# Altium schematic symbol library LATTICEPLDS_Library.SchLib: 291 symbols (part 11 of 32)
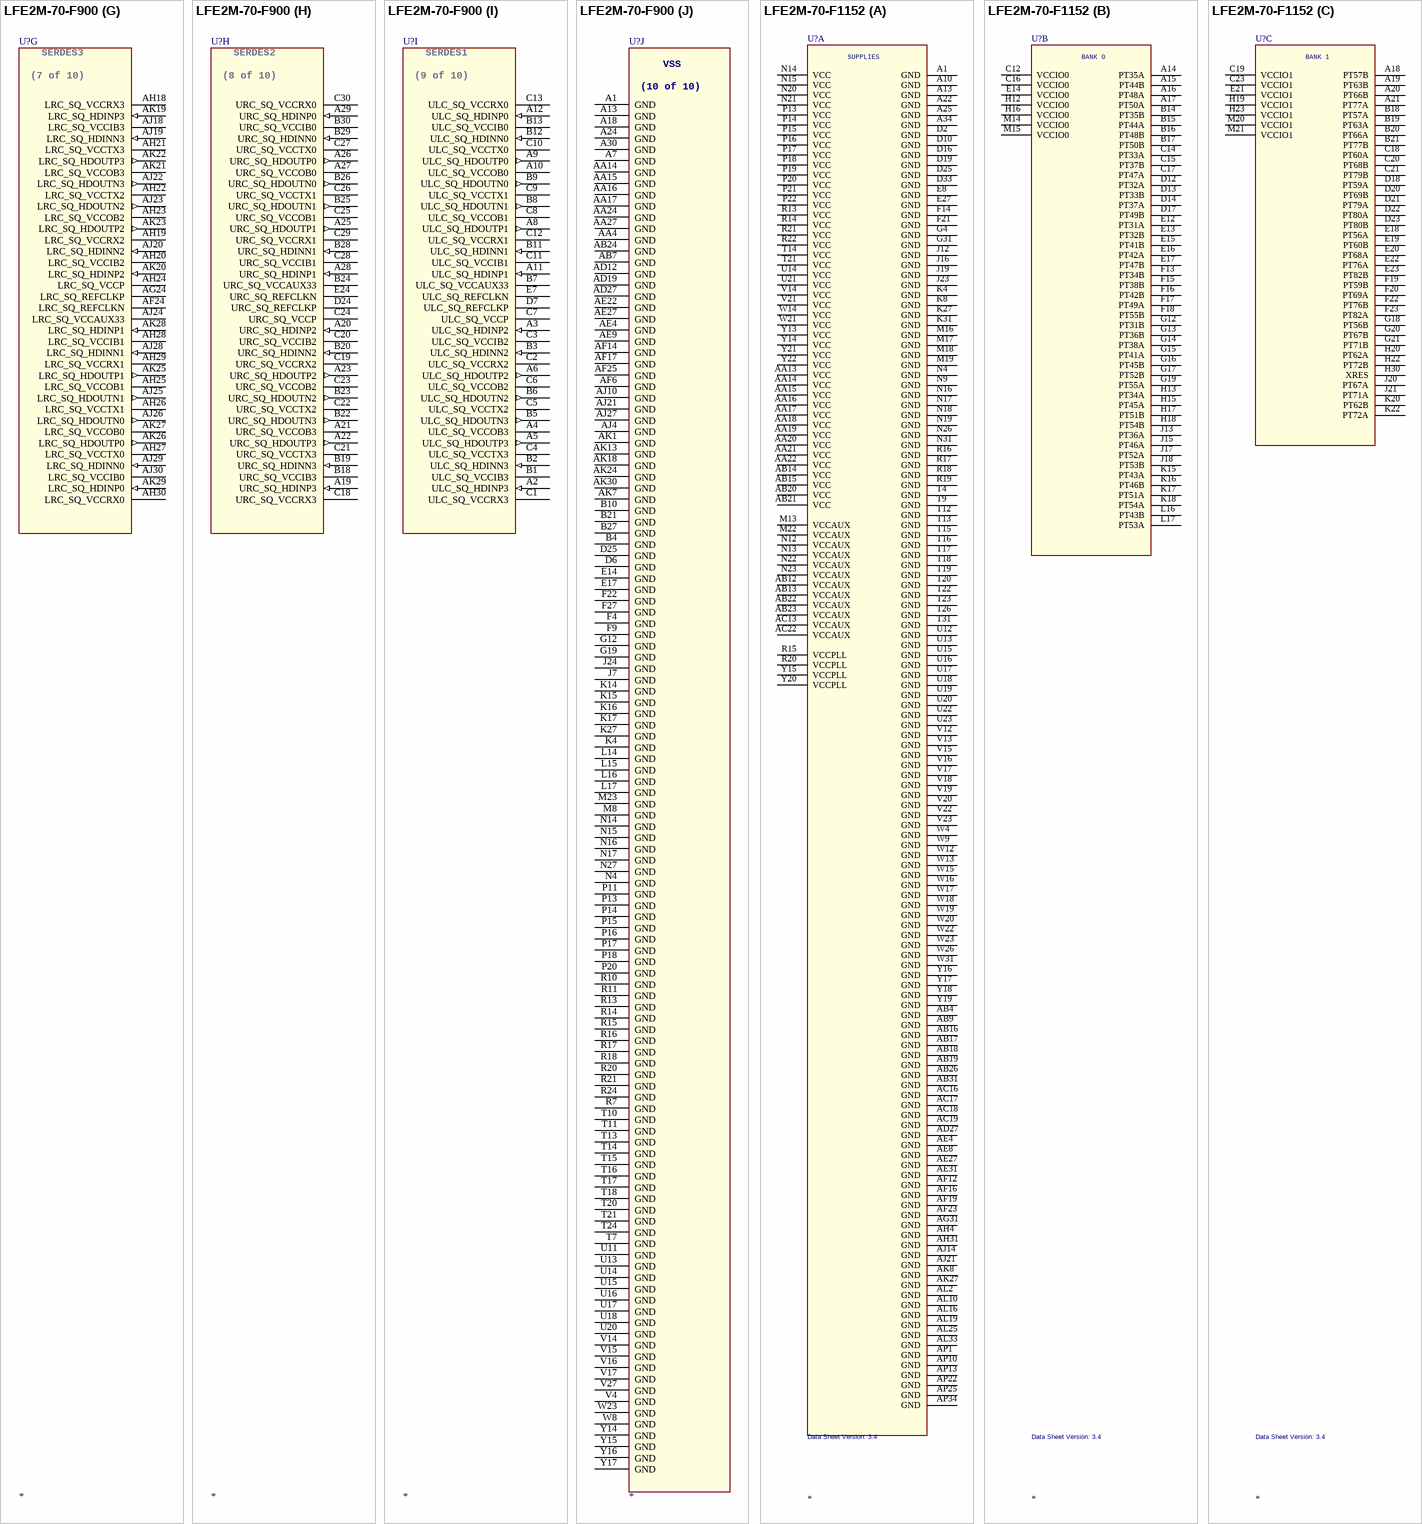
[diagram p313: symbols LFE2M-70-F900 to LFE2M-70-F1152]

## LFE2M-70-F900
designator U?
SPLIT_INST: TRUE; SWAP_INFO: (S1+S2+S3+S4+S5+S6+S7+S8+S9)
part A pins: AA1 PL73A (LDQS73) (io), AA2 PL73B (io), AA3 VCCIO6 (power), AA5 PL79A (io), AA6 PL79B (io), AA7 PL76B (io), AA8 PL81A (io), AA9 PL81B (io), AB1 PL74B (io), AB2 PL78A (io), AB3 PL78B (io), AB4 PL80A (io), AB5 PL80B (io), AB6 VCCIO6 (power), AB8 LLM0_PLLCAP (power), AC1 PL82A (LLM0_GPLLT_IN_A/LDQS82) (io), AC2 PL82B (LLM0_GPLLC_IN_A) (io), AC3 PL83B (LLM0_GPLLC_FB_A) (io), AC4 PL83A (LLM0_GPLLT_FB_A) (io), AC5 PL85A (LLM0_GDLLT_FB_A) (io), AC6 PL84B (LLM0_GDLLC_IN_A) (io), AC7 PL84A (LLM0_GDLLT_IN_A) (io), AD1 PL87B (io), AD2 PL87A (io), AD3 PL85B (LLM0_GDLLC_FB_A) (io), AE3 VCCIO6 (power), D1 PL14B (io), D2 PL9A (VREF2_7) (io), D3 PL9B (VREF1_7) (io), E1 PL17A (io), E2 PL14A (io), E3 PL12A (LUM0_SPLLT_FB_A) (io), E4 PL12B (LUM0_SPLLC_FB_A) (io), F1 PL18A (io), F2 PL17B (io), F3 VCCIO7 (power), F5 PL13B (io), G1 PL24B (io), G2 PL24A (io), G3 PL18B (io), G4 PL15B (io), G5 PL15A (LDQS15) (io), G6 PL13A (io), H1 PL31A (io), H2 PL28B (io), H3 PL28A (LDQS28) (io), H4 PL21B (io), H5 PL21A (io), H7 PL11B (LUM0_SPLLC_IN_A) (io), J1 PL31B (io), J2 PL30B (io), J3 PL30A (io), J4 PL22B (io), J5 PL22A (io), J6 VCCIO7 (power), J8 PL11A (LUM0_SPLLT_IN_A) (io), K1 PL35B (io), K2 PL35A (io), K3 VCCIO7 (power), K5 PL26B (io), K6 PL26A (io), K7 PL16A (io), K8 PL16B (io), L1 PL44A (io), L2 PL42B (LUM3_SPLLC_IN_A) (io), L3 PL42A (LUM3_SPLLT_IN_A) (io), L4 PL33B (io), L5 PL33A (io), L6 PL27B (io), L7 PL25B (io), L8 PL27A (io), L9 PL25A (io), M1 PL46A (LDQS46) (io), M2 PL44B (io), M3 PL39B (io), M4 PL39A (io), M5 PL37B (io), M6 PL37A (LDQS37) (io), M7 VCCIO7 (power), M9 PL29B (io), M10 VCCIO7 (power), N1 PL49A (PCLKT7_0) (io), N2 PL46B (io), N3 VCCIO7 (power), N5 PL38A (io), N6 PL38B (io), N7 PL34B (io), N8 PL29A (io), N9 PL34A (io), N10 VCCIO7 (power), P1 PL49B (PCLKC7_0) (io), P2 PL48B (io), P3 PL48A (io), P4 PL43B (LUM3_SPLLC_FB_A) (io), P5 PL43A (LUM3_SPLLT_FB_A) (io), P6 PL40A (io), P7 PL36B (io), P8 PL40B (io), P9 PL36A (io), P10 VCCIO7 (power), R1 PL54A (io), R2 PL53B (io), R3 PL53A (io), R4 PL45B (io), R5 PL45A (io), R6 VCCIO7 (power), R8 PL47A (io), T1 PL54B (io), T2 PL57B (LLM3_SPLLC_IN_A) (io), T3 PL57A (LLM3_SPLLT_IN_A) (io), T4 PL51B (PCLKC6_0) (io), T5 PL51A (PCLKT6_0) (io), T6 VCCIO6 (power), T8 PL52B (VREF1_6) (io), T9 PL47B (io), U1 PL64A (LDQS64) (io), U2 PL62B (io), U3 PL62A (io), U4 PL60B (io), U5 PL60A (io), U6 PL63B (io), U7 PL52A (VREF2_6) (io), U8 PL58B (LLM3_SPLLC_FB_A) (io), U9 PL58A (LLM3_SPLLT_FB_A) (io), U10 VCCIO6 (power), V1 PL66A (io), V2 PL64B (io), V3 VCCIO6 (power), V5 PL65A (io), V6 PL65B (io), V7 PL61B (io), V8 PL63A (io), V9 PL61A (io), V10 VCCIO6 (power), W1 PL66B (io), W2 PL70A (io), W3 PL69A (io), W4 PL69B (io), W5 PL67A (io), W6 PL67B (io), W7 VCCIO6 (power), W10 VCCIO6 (power), Y1 PL71A (io), Y2 PL71B (io), Y3 PL74A (io), Y4 PL70B (io), Y5 PL72A (io), Y6 PL72B (io), Y7 PL76A (io), Y8 PL75B (io), Y9 PL75A (io)
part B pins: AA12 VCCIO5 (power), AA13 VCCIO5 (power), AA18 VCCIO4 (power), AA19 VCCIO4 (power), AB18 PB79A (io), AC12 PB33B (io), AC13 PB35B (io), AC14 PB36B (io), AC15 PB42B (io), AC16 PB52A (VREF2_5) (io), AC17 PB62B (io), AC18 PB75B (io), AC19 PB78A (BDQS78) (io), AC20 PB79B (io), AC23 PB81A (io), AD9 PB31B (io), AD10 PB32B (io), AD11 PB39A (io), AD13 PB35A (io), AD14 PB40B (io), AD15 PB47A (io), AD16 PB60B (io), AD17 PB67A (io), AD18 PB75A (io), AD20 PB78B (io), AD23 PB81B (io), AD24 PB74A (io), AE8 PB30B (io), AE10 PB32A (io), AE11 PB31A (io), AE12 VCCIO5 (power), AE13 PB33A (BDQS33) (io), AE14 PB36A (io), AE15 PB42A (BDQS42) (io), AE16 PB52B (VREF1_5) (io), AE17 PB62A (io), AE18 PB76A (io), AE19 VCCIO4 (power), AE20 PB80A (io), AE21 PB80B (io), AE24 PB74B (io), AE25 PB73B (io), AF3 PB37A (io), AF4 PB37B (io), AF8 PB41B (io), AF9 VCCIO5 (power), AF10 PB30A (io), AF11 PB53B (PCLKC5_0) (io), AF12 PB40A (io), AF13 PB39B (io), AF15 PB47B (io), AF16 PB51A (BDQS51) (io), AF18 PB60A (BDQS60) (io), AF19 PB67B (io), AF21 PB66A (io), AF22 VCCIO4 (power), AF26 PB73A (io), AG2 PB34A (io), AG3 PB34B (io), AG4 PB38A (io), AG5 PB38B (io), AG6 VCCIO5 (power), AG8 PB41A (io), AG9 PB48B (io), AG10 PB48A (io), AG11 PB53A (PCLKT5_0) (io), AG12 PB49B (io), AG13 PB50B (io), AG14 VCCIO5 (power), AG15 PB50A (io), AG16 PB61B (io), AG17 VCCIO4 (power), AG18 PB65A (io), AG19 PB76B (io), AG20 PB64A (io), AG21 PB64B (io), AG22 PB66B (io), AG25 VCCIO4 (power), AH14 PB49A (io), AH15 PB51B (io), AH16 PB63A (io), AH17 PB71A (io), AJ14 PB58A (PCLKT4_0) (io), AJ15 PB61A (io), AJ16 PB65B (io), AJ17 PB71B (io), AK14 PB58B (PCLKC4_0) (io), AK15 PB59A (VREF2_4) (io), AK16 PB59B (VREF1_4) (io), AK17 PB63B (io)
part C pins: AA22 DI (io), AA23 BUSY (io), AA25 VCCIO8 (power), AA28 VCCIO3 (power), AA29 PR78B (io), AA30 PR83A (RLM0_GPLLT_IN_A) (io), AB22 RLM0_PLLCAP (io), AB23 CSN (in), AB25 VCCIO3 (power), AB26 PR80B (io), AB27 PR80A (io), AB28 PR82A (RLM0_GPLLT_FB_A/RDQS82) (io), AB29 PR82B (RLM0_GPLLC_FB_A) (io), AB30 PR83B (RLM0_GPLLC_IN_A) (io), AC24 INITN (io), AC25 D6 (io), AC26 DOUT_CSON (out), AC27 PR85B (RLM0_GDLLC_FB_A) (io), AC28 PR85A (RLM0_GDLLT_FB_A) (io), AC29 PR84B (RLM0_GDLLC_IN_A) (io), AC30 PR84A (RLM0_GDLLT_IN_A) (io), AD25 CFG1 (in), AD26 D2 (io), AD28 VCCIO8 (power), AD29 D5 (io), AD30 D7 (io), AE26 CS1N (in), AE28 VCCIO3 (power), AE29 D3 (io), AE30 D4 (io), AF27 DONE (io), AF28 WRITEN (in), AF29 D0 (io), AF30 D1 (io), AG27 CFG2 (in), AG28 CFG0 (in), AG29 CCLK (io), AG30 PROGRAMN (in), D27 PR12B (RUM0_SPLLC_FB_A) (io), D28 PR14B (io), D29 PR25A (io), D30 PR25B (io), E27 PR12A (RUM0_SPLLT_FB_A) (io), E28 PR14A (io), E29 PR30A (io), E30 PR30B (io), F24 PR9B (VREF2_2) (io), F25 PR9A (VREF1_2) (io), F26 PR11B (RUM0_SPLLC_IN_A) (io), F28 VCCIO2 (power), F29 PR31A (io), F30 PR31B (io), G24 PR13B (io), G25 PR11A (RUM0_SPLLT_IN_A) (io), G26 PR16A (io), G27 PR27A (io), G28 PR27B (io), G29 PR34A (io), G30 PR38A (io), H23 PR15B (io), H24 PR15A (RDQS15) (io), H25 PR13A (io), H26 PR17A (io), H27 PR16B (io), H28 PR28B (io), H29 PR34B (io), H30 PR38B (io), J22 PR20B (io), J23 PR20A (io), J25 VCCIO2 (power), J26 PR17B (io), J27 PR22B (io), J28 PR28A (RDQS28) (io), J29 PR43A (RUM3_SPLLT_FB_A) (io), J30 PR43B (RUM3_SPLLC_FB_A) (io), K22 PR21A (io), K23 PR21B (io), K24 PR24B (io), K25 PR24A (io), K26 PR22A (io), K28 VCCIO2 (power), K29 PR45A (io), K30 PR45B (io), L22 PR33B (io), L23 PR26A (io), L24 PR26B (io), L25 PR29B (io), L26 PR29A (io), L27 PR35A (io), L28 PR35B (io), L29 PR36A (io), L30 PR36B (io), M21 VCCIO2 (power), M22 PR33A (io), M24 VCCIO2 (power), M25 PR37B (io), M26 PR37A (RDQS37) (io), M27 PR39B (io), M28 PR39A (io), M29 PR49A (PCLKT2_0) (io), M30 PR49B (PCLKC2_0) (io), N21 VCCIO2 (power), N22 PR44B (io), N23 PR42A (RUM3_SPLLT_IN_A) (io), N24 PR42B (RUM3_SPLLC_IN_A) (io), N25 PR40B (io), N26 PR40A (io), N28 VCCIO2 (power), N29 PR53A (io), N30 PR53B (io), P21 VCCIO2 (power), P22 PR44A (io), P23 PR48B (io), P24 PR48A (io), P25 PR46B (io), P26 PR46A (RDQS46) (io), P27 PR47A (io), P28 PR51A (PCLKT3_0) (io), P29 PR51B (PCLKC3_0) (io), P30 PR57B (RLM3_SPLLC_IN_A) (io), R22 PR58A (RLM3_SPLLT_FB_A) (io), R23 PR58B (RLM3_SPLLC_FB_A) (io), R25 VCCIO2 (power), R26 PR47B (io), R27 PR52B (VREF2_3) (io), R28 PR52A (VREF1_3) (io), R29 PR57A (RLM3_SPLLT_IN_A) (io), R30 PR62A (io), T22 PR61A (io), T23 PR61B (io), T25 VCCIO3 (power), T26 PR56A (io), T27 PR56B (io), T28 PR60A (io), T29 PR60B (io), T30 PR62B (io), U21 VCCIO3 (power), U23 PR65B (io), U24 PR63A (io), U25 PR63B (io), U26 PR64A (RDQS64) (io), U27 PR66A (io), U28 PR66B (io), U29 PR71B (io), U30 PR70A (io), V21 VCCIO3 (power), V22 PR75A (io), V23 PR65A (io), V24 PR67B (io), V25 PR67A (io), V26 PR64B (io), V28 VCCIO3 (power), V29 PR71A (io), V30 PR70B (io), W21 VCCIO3 (power), W22 PR75B (io), W24 VCCIO3 (power), W25 PR72B (io), W26 PR72A (io), W27 PR69B (io), W28 PR69A (io), W29 PR73A (RDQS73) (io), W30 PR73B (io), Y22 PR81B (io), Y23 PR81A (io), Y24 PR79B (io), Y25 PR79A (io), Y26 PR74A (io), Y27 PR74B (io), Y28 PR78A (io), Y29 PR76A (io), Y30 PR76B (io)
part D pins: A14 PT51B (io), A15 PT57B (VREF2_1) (io), A16 PT63B (io), A17 PT73B (io), B14 PT51A (io), B15 PT57A (VREF1_1) (io), B16 PT63A (io), B17 PT73A (io), C14 PT54B (VREF2_0) (io), C15 PT55B (PCLKC0_0) (io), C16 PT59B (io), C17 PT74A (io), D4 PT47B (io), D5 PT47A (io), D8 PT43A (io), D9 PT39A (io), D11 PT30A (io), D12 PT37B (io), D13 PT50B (io), D14 VCCIO0 (power), D15 PT55A (PCLKT0_0) (io), D16 PT59A (io), D17 VCCIO1 (power), D18 PT74B (io), D19 PT75B (io), D20 PT77B (io), D21 PT77A (io), D22 PT79B (io), D23 PT82B (io), D26 PT81B (io), E5 PT46B (io), E6 VCCIO0 (power), E8 PT39B (io), E9 VCCIO0 (power), E12 PT30B (io), E13 PT37A (io), E15 PT54A (VREF1_0) (io), E16 PT56A (PCLKT1_0) (io), E18 PT75A (io), E19 PT76A (io), E20 PT76B (io), E21 PT82A (io), E22 VCCIO1 (power), E23 PT80B (io), E25 VCCIO1 (power), E26 PT81A (io), F6 PT46A (io), F7 PT43B (io), F11 PT29A (io), F12 VCCIO0 (power), F13 PT50A (io), F14 PT52B (io), F15 PT56B (PCLKC1_0) (io), F16 PT61A (io), F17 PT64A (io), F18 PT64B (io), F19 VCCIO1 (power), F21 PT79A (io), G11 PT41A (io), G13 PT49B (io), G14 PT53B (io), G15 PT60A (io), G16 PT62A (io), G17 PT62B (io), G18 PT78B (io), G22 PT80A (io), H10 PT31A (io), H11 PT29B (io), H12 PT40A (io), H13 PT40B (io), H14 PT52A (io), H15 PT58A (io), H16 PT61B (io), H17 PT65B (io), H18 PT78A (io), J11 PT49A (io), J12 PT31B (io), J13 PT41B (io), J14 PT53A (io), J15 PT58B (io), J16 PT60B (io), J17 PT65A (io), J18 PT66B (io), J19 PT66A (io), K12 VCCIO0 (power), K13 VCCIO0 (power), K18 VCCIO1 (power), K19 VCCIO1 (power)
part E pins: AA10 VCCAUX (power), AA11 VCCAUX (power), AA20 VCCAUX (power), AA21 VCCAUX (power), AA26 NC, AB9 NC, AB10 NC, AB11 NC, AB12 NC, AB13 NC, AB14 NC, AB15 NC, AB16 NC, AB17 NC, AB19 NC, AB20 NC, AB21 NC, AC8 NC, AC9 NC, AC10 NC, AC11 NC, AC21 NC, AC22 NC, AD4 NC, AD5 NC, AD6 NC, AD7 NC, AD8 NC, AD21 NC, AD22 NC, AE1 TDI (in), AE2 TCK (in), AE5 NC, AE6 NC, AE7 NC, AE23 NC, AF1 TDO (out), AF2 TMS (in), AF5 NC, AF20 NC, AF23 NC, AG1 VCCJ (power), AG23 NC, AG26 NC, D10 NC, E10 NC, E11 NC, F8 NC, F10 NC, F20 NC, F23 NC, G7 NC, G8 NC, G9 NC, G10 NC, G20 NC, G21 NC, G23 XRES (power), H6 NC, H8 NC, H9 NC, H19 NC, H20 NC, H21 NC, H22 NC, J9 NC, J10 NC, J20 NC, J21 NC, K9 NC, K10 VCCAUX (power), K11 VCCAUX (power), K20 VCCAUX (power), K21 VCCAUX (power), L10 VCCAUX (power), L11 VCCAUX (power), L12 VCC (power), L13 VCC (power), L18 VCC (power), L19 VCC (power), L20 VCCAUX (power), L21 VCCAUX (power), M11 VCC (power), M12 VCC (power), M13 VCC (power), M14 VCC (power), M15 VCC (power), M16 VCC (power), M17 VCC (power), M18 VCC (power), M19 VCC (power), M20 VCC (power), N11 VCC (power), N12 VCC (power), N13 VCCPLL (power), N18 VCCPLL (power), N19 VCC (power), N20 VCC (power), P12 VCC (power), P19 VCC (power), R9 NC, R12 VCC (power), R19 VCC (power), T12 VCC (power), T19 VCC (power), U12 VCC (power), U19 VCC (power), U22 NC, V11 VCC (power), V12 VCC (power), V13 VCCPLL (power), V18 VCCPLL (power), V19 VCC (power), V20 VCC (power), W9 NC, W11 VCC (power), W12 VCC (power), W13 VCC (power), W14 VCC (power), W15 VCC (power), W16 VCC (power), W17 VCC (power), W18 VCC (power), W19 VCC (power), W20 VCC (power), Y10 VCCAUX (power), Y11 VCCAUX (power), Y12 VCC (power), Y13 VCC (power), Y18 VCC (power), Y19 VCC (power), Y20 VCCAUX (power), Y21 VCCAUX (power)
part F pins: AF7 LLC_SQ_REFCLKN (in), AG7 LLC_SQ_REFCLKP (in), AH1 LLC_SQ_VCCRX3 (power), AH2 LLC_SQ_VCCRX2 (power), AH3 LLC_SQ_VCCIB2 (power), AH4 LLC_SQ_VCCTX3 (power), AH5 LLC_SQ_VCCTX2 (power), AH6 LLC_SQ_VCCOB2 (power), AH7 LLC_SQ_VCCP (power), AH8 LLC_SQ_VCCOB1 (power), AH9 LLC_SQ_VCCTX1 (power), AH10 LLC_SQ_VCCTX0 (power), AH11 LLC_SQ_VCCIB1 (power), AH12 LLC_SQ_VCCRX1 (power), AH13 LLC_SQ_VCCRX0 (power), AJ1 LLC_SQ_VCCIB3 (power), AJ2 LLC_SQ_HDINN3 (in), AJ3 LLC_SQ_HDINN2 (in), AJ5 LLC_SQ_HDOUTN3 (out), AJ6 LLC_SQ_HDOUTN2 (out), AJ7 LLC_SQ_VCCAUX33 (power), AJ8 LLC_SQ_HDOUTN1 (out), AJ9 LLC_SQ_HDOUTN0 (out), AJ11 LLC_SQ_HDINN1 (in), AJ12 LLC_SQ_HDINN0 (in), AJ13 LLC_SQ_VCCIB0 (power), AK2 LLC_SQ_HDINP3 (in), AK3 LLC_SQ_HDINP2 (in), AK4 LLC_SQ_VCCOB3 (power), AK5 LLC_SQ_HDOUTP3 (out), AK6 LLC_SQ_HDOUTP2 (out), AK8 LLC_SQ_HDOUTP1 (out), AK9 LLC_SQ_HDOUTP0 (out), AK10 LLC_SQ_VCCOB0 (power), AK11 LLC_SQ_HDINP1 (in), AK12 LLC_SQ_HDINP0 (in)
part G pins: AF24 LRC_SQ_REFCLKN (power), AG24 LRC_SQ_REFCLKP (power), AH18 LRC_SQ_VCCRX3 (power), AH19 LRC_SQ_VCCRX2 (power), AH20 LRC_SQ_VCCIB2 (power), AH21 LRC_SQ_VCCTX3 (power), AH22 LRC_SQ_VCCTX2 (power), AH23 LRC_SQ_VCCOB2 (power), AH24 LRC_SQ_VCCP (power), AH25 LRC_SQ_VCCOB1 (power), AH26 LRC_SQ_VCCTX1 (power), AH27 LRC_SQ_VCCTX0 (power), AH28 LRC_SQ_VCCIB1 (power), AH29 LRC_SQ_VCCRX1 (power), AH30 LRC_SQ_VCCRX0 (power), AJ18 LRC_SQ_VCCIB3 (power), AJ19 LRC_SQ_HDINN3 (in), AJ20 LRC_SQ_HDINN2 (in), AJ22 LRC_SQ_HDOUTN3 (out), AJ23 LRC_SQ_HDOUTN2 (out), AJ24 LRC_SQ_VCCAUX33 (power), AJ25 LRC_SQ_HDOUTN1 (out), AJ26 LRC_SQ_HDOUTN0 (out), AJ28 LRC_SQ_HDINN1 (in), AJ29 LRC_SQ_HDINN0 (in), AJ30 LRC_SQ_VCCIB0 (power), AK19 LRC_SQ_HDINP3 (in), AK20 LRC_SQ_HDINP2 (in), AK21 LRC_SQ_VCCOB3 (power), AK22 LRC_SQ_HDOUTP3 (out), AK23 LRC_SQ_HDOUTP2 (out), AK25 LRC_SQ_HDOUTP1 (out), AK26 LRC_SQ_HDOUTP0 (out), AK27 LRC_SQ_VCCOB0 (power), AK28 LRC_SQ_HDINP1 (in), AK29 LRC_SQ_HDINP0 (in)
part H pins: A19 URC_SQ_HDINP3 (in), A20 URC_SQ_HDINP2 (in), A21 URC_SQ_VCCOB3 (power), A22 URC_SQ_HDOUTP3 (out), A23 URC_SQ_HDOUTP2 (out), A25 URC_SQ_HDOUTP1 (out), A26 URC_SQ_HDOUTP0 (out), A27 URC_SQ_VCCOB0 (power), A28 URC_SQ_HDINP1 (in), A29 URC_SQ_HDINP0 (in), B18 URC_SQ_VCCIB3 (power), B19 URC_SQ_HDINN3 (in), B20 URC_SQ_HDINN2 (in), B22 URC_SQ_HDOUTN3 (out), B23 URC_SQ_HDOUTN2 (out), B24 URC_SQ_VCCAUX33 (power), B25 URC_SQ_HDOUTN1 (out), B26 URC_SQ_HDOUTN0 (out), B28 URC_SQ_HDINN1 (in), B29 URC_SQ_HDINN0 (in), B30 URC_SQ_VCCIB0 (power), C18 URC_SQ_VCCRX3 (power), C19 URC_SQ_VCCRX2 (power), C20 URC_SQ_VCCIB2 (power), C21 URC_SQ_VCCTX3 (power), C22 URC_SQ_VCCTX2 (power), C23 URC_SQ_VCCOB2 (power), C24 URC_SQ_VCCP (power), C25 URC_SQ_VCCOB1 (power), C26 URC_SQ_VCCTX1 (power), C27 URC_SQ_VCCTX0 (power), C28 URC_SQ_VCCIB1 (power), C29 URC_SQ_VCCRX1 (power), C30 URC_SQ_VCCRX0 (power), D24 URC_SQ_REFCLKP (power), E24 URC_SQ_REFCLKN (power)
part I pins: A2 ULC_SQ_HDINP3 (in), A3 ULC_SQ_HDINP2 (in), A4 ULC_SQ_VCCOB3 (power), A5 ULC_SQ_HDOUTP3 (out), A6 ULC_SQ_HDOUTP2 (out), A8 ULC_SQ_HDOUTP1 (out), A9 ULC_SQ_HDOUTP0 (out), A10 ULC_SQ_VCCOB0 (power), A11 ULC_SQ_HDINP1 (in), A12 ULC_SQ_HDINP0 (in), B1 ULC_SQ_VCCIB3 (power), B2 ULC_SQ_HDINN3 (in), B3 ULC_SQ_HDINN2 (in), B5 ULC_SQ_HDOUTN3 (out), B6 ULC_SQ_HDOUTN2 (out), B7 ULC_SQ_VCCAUX33 (power), B8 ULC_SQ_HDOUTN1 (out), B9 ULC_SQ_HDOUTN0 (out), B11 ULC_SQ_HDINN1 (in), B12 ULC_SQ_HDINN0 (in), B13 ULC_SQ_VCCIB0 (power), C1 ULC_SQ_VCCRX3 (power), C2 ULC_SQ_VCCRX2 (power), C3 ULC_SQ_VCCIB2 (power), C4 ULC_SQ_VCCTX3 (power), C5 ULC_SQ_VCCTX2 (power), C6 ULC_SQ_VCCOB2 (power), C7 ULC_SQ_VCCP (power), C8 ULC_SQ_VCCOB1 (power), C9 ULC_SQ_VCCTX1 (power), C10 ULC_SQ_VCCTX0 (power), C11 ULC_SQ_VCCIB1 (power), C12 ULC_SQ_VCCRX1 (power), C13 ULC_SQ_VCCRX0 (power), D7 ULC_SQ_REFCLKP (power), E7 ULC_SQ_REFCLKN (power)
part J pins: A1 GND (power), A7 GND (power), A13 GND (power), A18 GND (power), A24 GND (power), A30 GND (power), AA4 GND (power), AA14 GND (power), AA15 GND (power), AA16 GND (power), AA17 GND (power), AA24 GND (power), AA27 GND (power), AB7 GND (power), AB24 GND (power), AD12 GND (power), AD19 GND (power), AD27 GND (power), AE4 GND (power), AE9 GND (power), AE22 GND (power), AE27 GND (power), AF6 GND (power), AF14 GND (power), AF17 GND (power), AF25 GND (power), AJ4 GND (power), AJ10 GND (power), AJ21 GND (power), AJ27 GND (power), AK1 GND (power), AK7 GND (power), AK13 GND (power), AK18 GND (power), AK24 GND (power), AK30 GND (power), B4 GND (power), B10 GND (power), B21 GND (power), B27 GND (power), D6 GND (power), D25 GND (power), E14 GND (power), E17 GND (power), F4 GND (power), F9 GND (power), F22 GND (power), F27 GND (power), G12 GND (power), G19 GND (power), J7 GND (power), J24 GND (power), K4 GND (power), K14 GND (power), K15 GND (power), K16 GND (power), K17 GND (power), K27 GND (power), L14 GND (power), L15 GND (power), L16 GND (power), L17 GND (power), M8 GND (power), M23 GND (power), N4 GND (power), N14 GND (power), N15 GND (power), N16 GND (power), N17 GND (power), N27 GND (power), P11 GND (power), P13 GND (power), P14 GND (power), P15 GND (power), P16 GND (power), P17 GND (power), P18 GND (power), P20 GND (power), R7 GND (power), R10 GND (power), R11 GND (power), R13 GND (power), R14 GND (power), R15 GND (power), R16 GND (power), R17 GND (power), R18 GND (power), R20 GND (power), R21 GND (power), R24 GND (power), T7 GND (power), T10 GND (power), T11 GND (power), T13 GND (power), T14 GND (power), T15 GND (power), T16 GND (power), T17 GND (power), T18 GND (power), T20 GND (power), T21 GND (power), T24 GND (power), U11 GND (power), U13 GND (power), U14 GND (power), U15 GND (power), U16 GND (power), U17 GND (power), U18 GND (power), U20 GND (power), V4 GND (power), V14 GND (power), V15 GND (power), V16 GND (power), V17 GND (power), V27 GND (power), W8 GND (power), W23 GND (power), Y14 GND (power), Y15 GND (power), Y16 GND (power), Y17 GND (power)

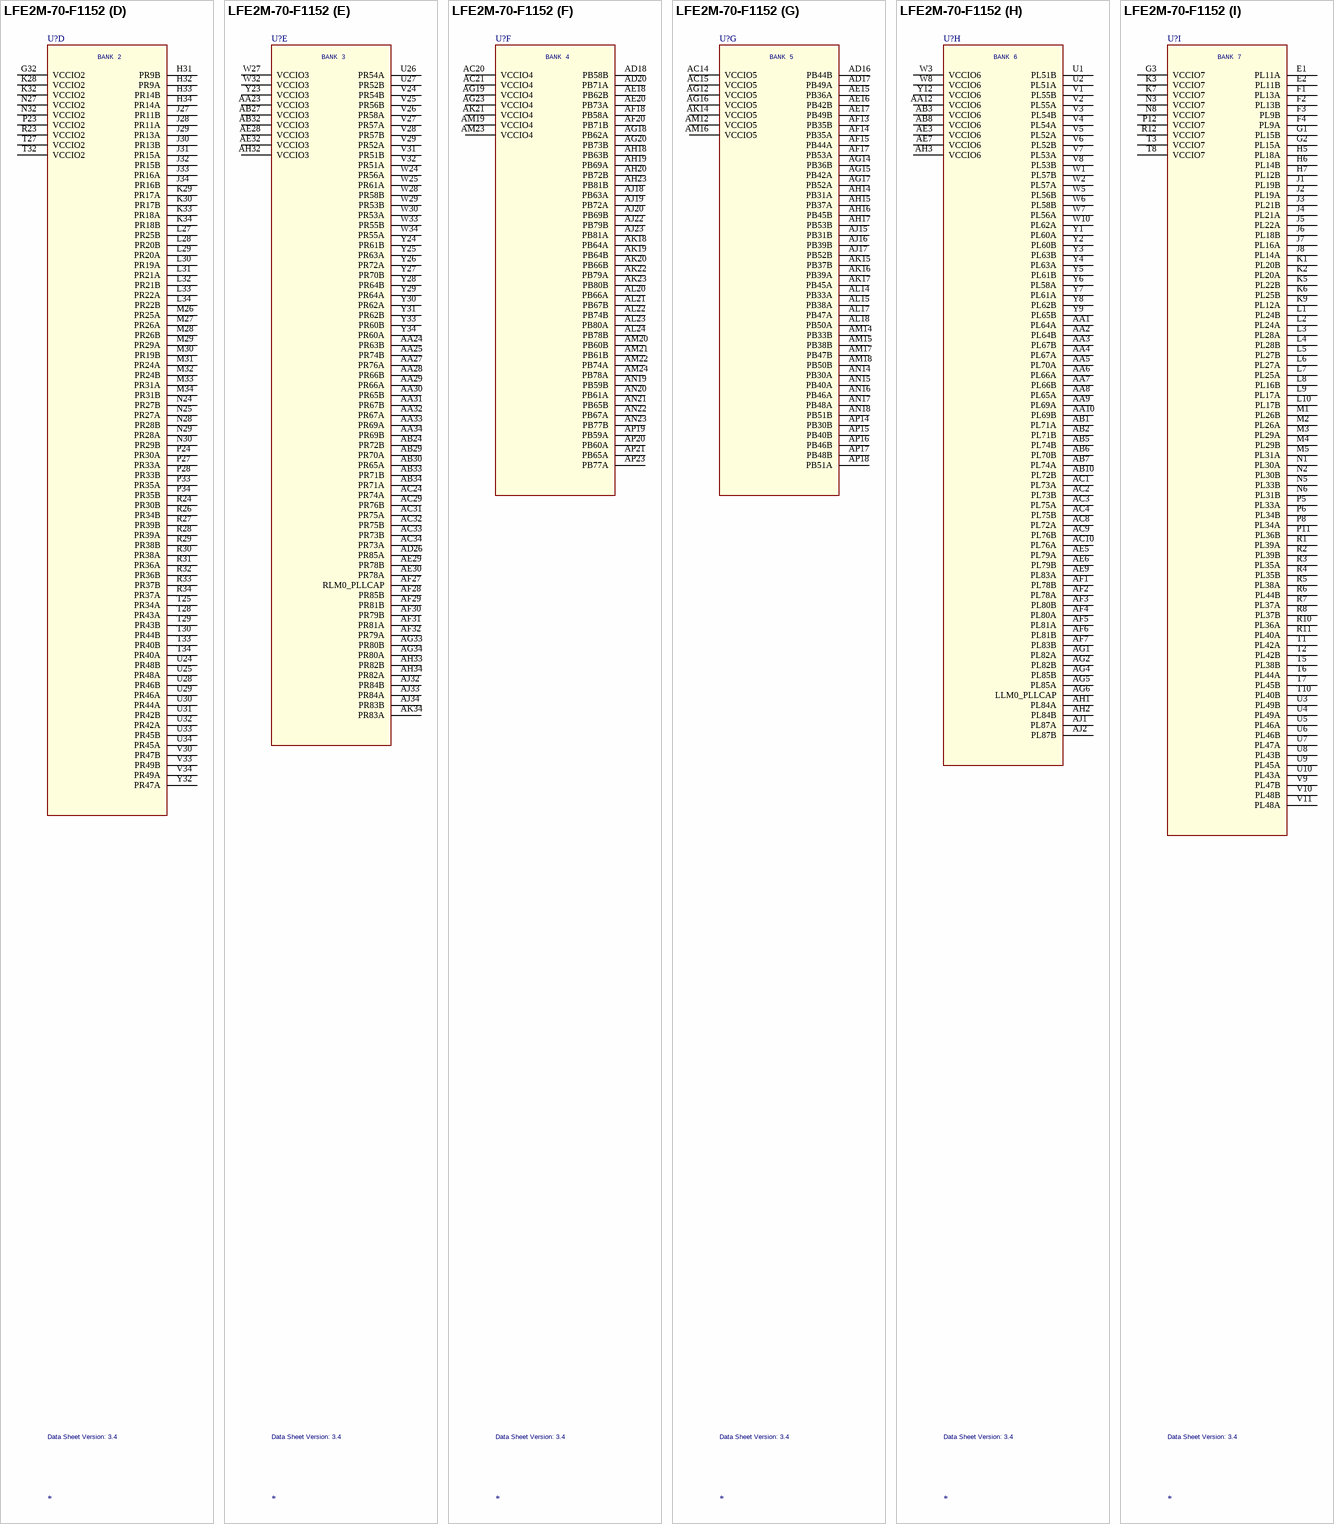
[diagram p115: symbol LFE2M-70-F1152]

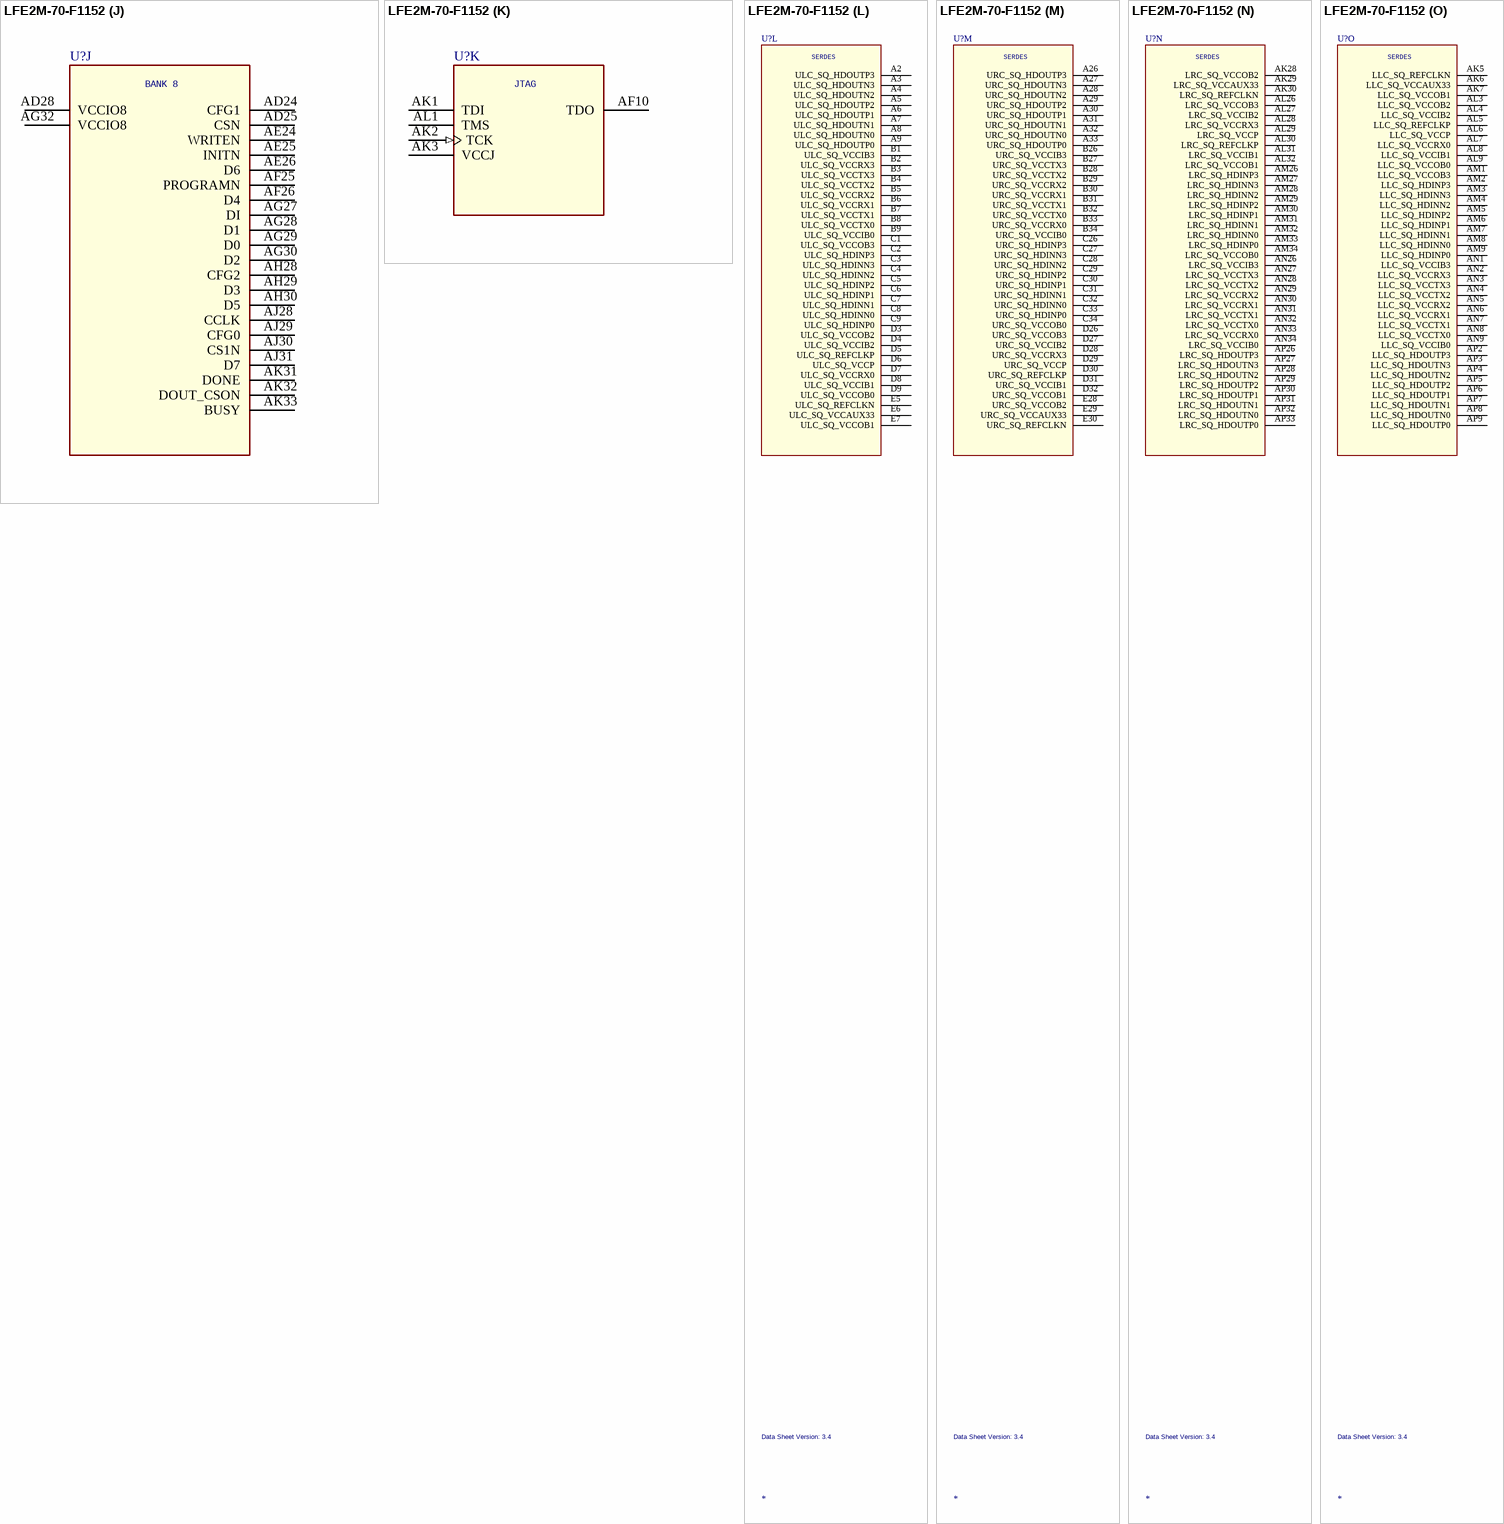
[diagram p116: symbol LFE2M-70-F1152]
